# Altium footprint library Hydrolib_pcb.PcbLib: 97 footprints (part 4 of 7)
Each footprint in its own frame and in the unit in brackets; x right, y up, seen from the top. Pads: shape width x height; smd on the part's side, far side on the other; paste and mask are expansions set on the pad; w line width, h text height; cw(c..) or ccw(c..) is an arc to the next point about the centre after c.
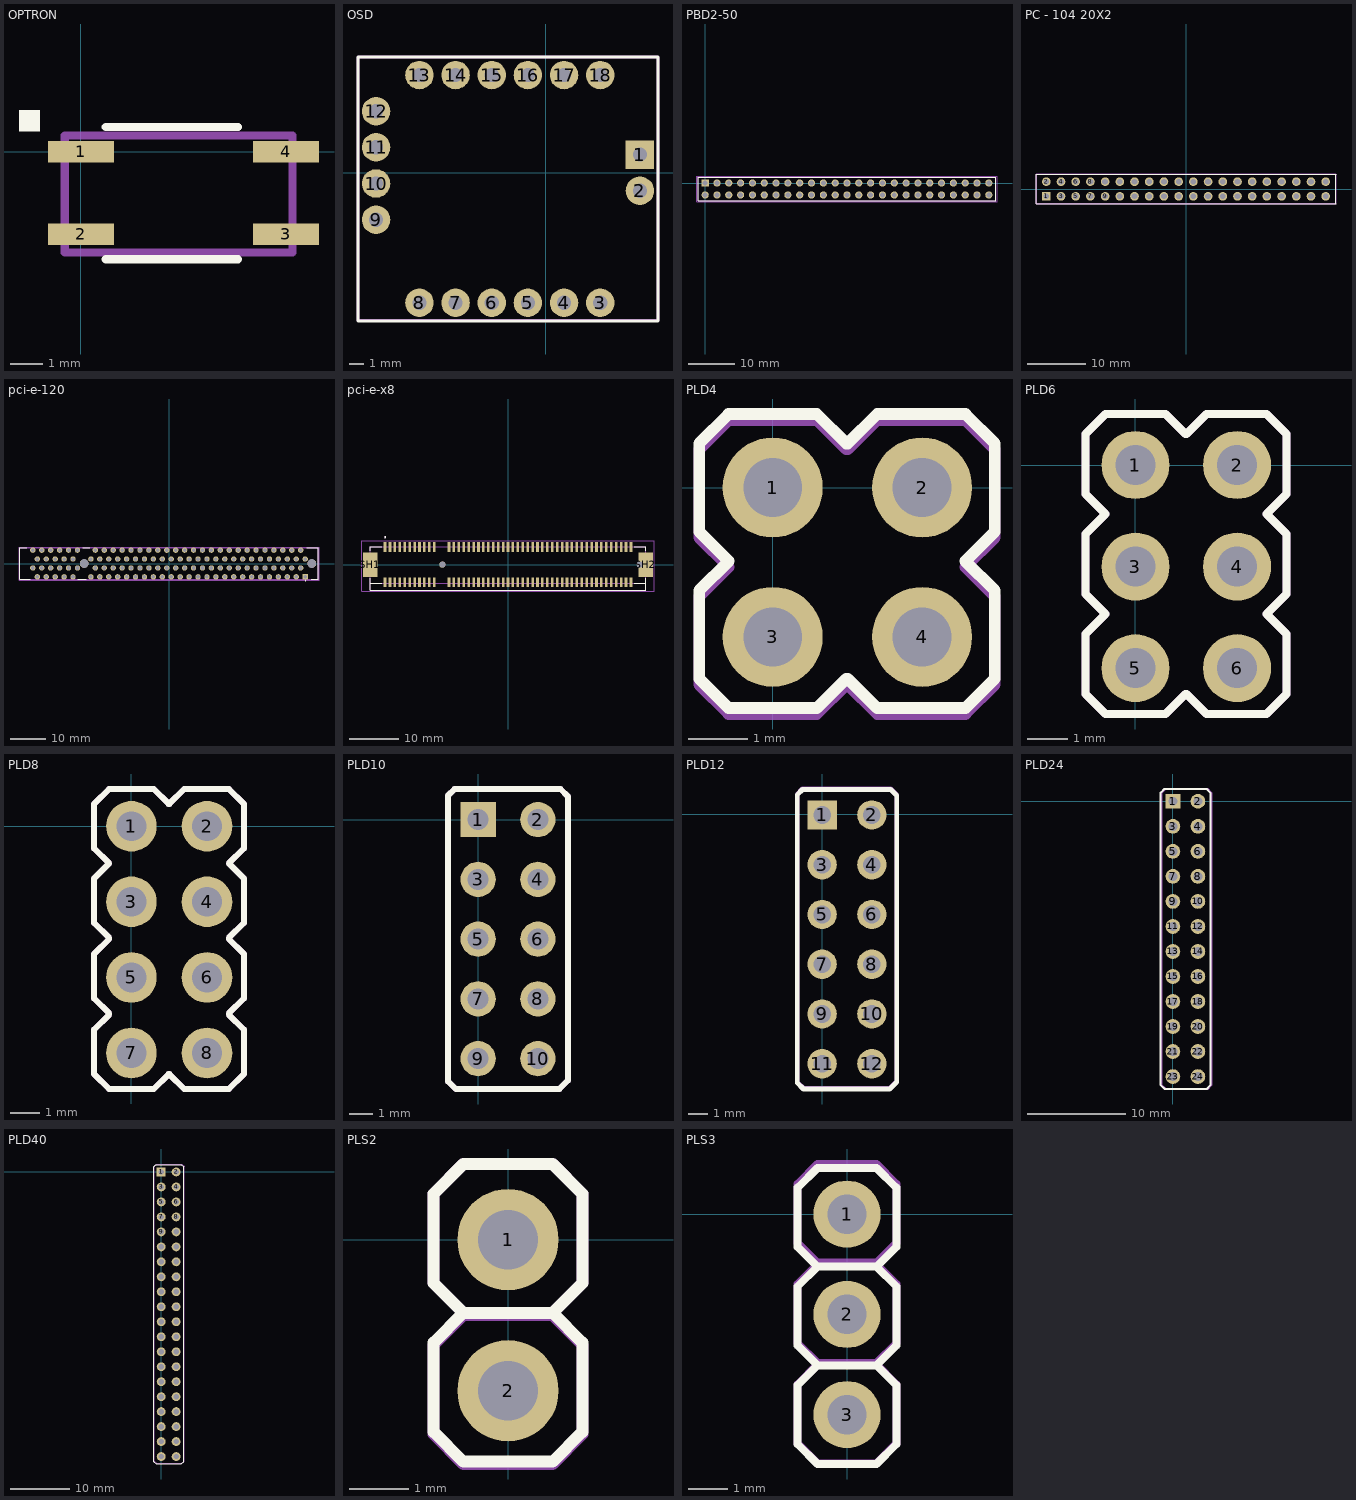
[diagram p3: the footprints below, top view; thin cyan lines are the x and y axes]

## OPTRON [mil]
pads (4):
  rect 80x26 smd: 1(0,0) 2(0,-100) 3(248.03,-100) 4(248.03,0)
Top Overlay:
  region: -75,25 -50,25 -50,50 -75,50
  lines w10: 30,-130 190,-130 ; 30,30 190,30
Pattern top:
  lines w9.84: -19.68,-122.05 -19.68,19.68 255.91,19.68 255.91,-122.05 -19.68,-122.05
  text ".Designator" at -11.81,66.93 h84.65
3D body "User Library-HCPL-181-1.STEP": height 78.74, standoff -3.96, extent -19.68,-122.05 255.91,19.69

## OSD [mm] "IDC-10 Male Connector"
height 9
pads (18):
  rect 2x2 hole 1: 1(6.604,1.27)
  round 2 hole 1: 2(6.604,-1.27) 3(3.81,-9.144) 4(1.27,-9.144) 5(-1.27,-9.144) 6(-3.81,-9.144) 7(-6.35,-9.144) 8(-8.89,-9.144) 9(-11.938,-3.302) 10(-11.938,-0.762) 11(-11.938,1.778) 12(-11.938,4.318) 13(-8.89,6.858) 14(-6.35,6.858) 15(-3.81,6.858) 16(-1.27,6.858) 17(1.27,6.858) 18(3.81,6.858)
Top Overlay:
  lines w0.2: -13.208,-1.016 -13.208,8.128 7.874,8.128 7.874,-10.425 -13.208,-10.425 -13.208,-1
Pattern top:
  lines w0.2: -13.208,-10.4 -13.208,8.128 7.874,8.128 7.874,-10.4 -13.208,-10.4
  text ".Designator" at -4.064,8.89 h2.15
3D body "Сборка1.STEP": height 4.32, standoff -6.2, extent -13.08,-10.5 7.96,8

## PBD2-50 [mm] "Socket, 2x25 Pins, Vertical, 2.54mm Pitch, Female"
height 8.51
pads (50):
  rect 1.55x1.55 hole 1.04: 1(0,0)
  round 1.55 hole 1.04: 2(0,-2.54) 3(2.54,0) 4(2.54,-2.54) 5(5.08,0) 6(5.08,-2.54) 7(7.62,0) 8(7.62,-2.54) 9(10.16,0) 10(10.16,-2.54) 11(12.7,0) 12(12.7,-2.54) 13(15.24,0) 14(15.24,-2.54) 15(17.78,0) 16(17.78,-2.54) 17(20.32,0) 18(20.32,-2.54) 19(22.86,0) 20(22.86,-2.54) 21(25.4,0) 22(25.4,-2.54) 23(27.94,0) 24(27.94,-2.54) 25(30.48,0) 26(30.48,-2.54) 27(33.02,0) 28(33.02,-2.54) 29(35.56,0) 30(35.56,-2.54) 31(38.1,0) 32(38.1,-2.54) 33(40.64,0) 34(40.64,-2.54) 35(43.18,0) 36(43.18,-2.54) 37(45.72,0) 38(45.72,-2.54) 39(48.26,0) 40(48.26,-2.54) 41(50.8,0) 42(50.8,-2.54) 43(53.34,0) 44(53.34,-2.54) 45(55.88,0) 46(55.88,-2.54) 47(58.42,0) 48(58.42,-2.54) 49(60.96,0) 50(60.96,-2.54)
Top Overlay:
  lines w0.2: -1.525,-3.745 -1.525,1.205 62.485,1.205 62.485,-3.745 -1.525,-3.745
Mechanical 13:
  lines w0.1: -1.525,-3.745 -1.525,1.205 62.485,1.205 62.485,-3.745 -1.525,-3.745
Mechanical 15:
  lines w0.05: -1.75,-3.97 -1.75,1.43 62.71,1.43 62.71,-3.97 -1.75,-3.97
3D body "SSW-125-01-X-D.step": height 8.41, standoff -2.64, extent -1.524,-3.746 62.484,1.207

## PC - 104 20X2 [mm] "Connector; Header; 20x2 Position"
height 11.1
pads (40):
  rect 1.5x1.5 hole 1: 1(-24.13,-1.27)
  round 1.5 hole 1: 2(-24.13,1.27) 3(-21.59,-1.27) 4(-21.59,1.27) 5(-19.05,-1.27) 6(-19.05,1.27) 7(-16.51,-1.27) 8(-16.51,1.27) 9(-13.97,-1.27) 10(-13.97,1.27) 11(-11.43,-1.27) 12(-11.43,1.27) 13(-8.89,-1.27) 14(-8.89,1.27) 15(-6.35,-1.27) 16(-6.35,1.27) 17(-3.81,-1.27) 18(-3.81,1.27) 19(-1.27,-1.27) 20(-1.27,1.27) 21(1.27,-1.27) 22(1.27,1.27) 23(3.81,-1.27) 24(3.81,1.27) 25(6.35,-1.27) 26(6.35,1.27) 27(8.89,-1.27) 28(8.89,1.27) 29(11.43,-1.27) 30(11.43,1.27) 31(13.97,-1.27) 32(13.97,1.27) 33(16.51,-1.27) 34(16.51,1.27) 35(19.05,-1.27) 36(19.05,1.27) 37(21.59,-1.27) 38(21.59,1.27) 39(24.13,-1.27) 40(24.13,1.27)
Top Overlay:
  lines w0.2: -25.91,-2.54 25.91,-2.54 ; -25.91,2.54 25.91,2.54 ; -25.908,-2.54 -25.908,2.54 ; 25.908,-2.54 25.908,2.54
Bottom Overlay:
  lines w0.2: -25.91,-2.54 25.91,-2.54 ; -25.91,2.54 25.91,2.54 ; -25.908,-2.54 -25.908,2.54 ; 25.908,-2.54 25.908,2.54
Pattern top:
  lines w0.25: -25.91,-2.54 -25.91,2.54 25.908,2.54 25.908,-2.54 -25.91,-2.54
  text ".Designator" at -5.93,4.53 h2.15
3D body "25953.stp": height 12.5, standoff -10.7, extent -25.88,-2.47 25.92,2.43

## PCBComponent_1 [mm]

## pci-e-120 [mm]
pads (122):
  rect 1.53x1.53 hole 1.02: 1(38.735,-3.81)
  round 1.53 hole 1.02: 2(37.465,-1.27) 3(36.195,-3.81) 4(34.925,-1.27) 5(33.655,-3.81) 6(32.385,-1.27) 7(31.115,-3.81) 8(29.845,-1.27) 9(28.575,-3.81) 10(27.305,-1.27) 11(26.035,-3.81) 12(24.765,-1.27) 13(23.495,-3.81) 14(22.225,-1.27) 15(20.955,-3.81) 16(19.685,-1.27) 17(18.415,-3.81) 18(17.145,-1.27) 19(15.875,-3.81) 20(14.605,-1.27) 21(13.335,-3.81) 22(12.065,-1.27) 23(10.795,-3.81) 24(9.525,-1.27) 25(8.255,-3.81) 26(6.985,-1.27) 27(5.715,-3.81) 28(4.445,-1.27) 29(3.175,-3.81) 30(1.905,-1.27) 31(0.635,-3.81) 32(-0.635,-1.27) 33(-1.905,-3.81) 34(-3.175,-1.27) 35(-4.445,-3.81) 36(-5.715,-1.27) 37(-6.985,-3.81) 38(-8.255,-1.27) 39(-9.525,-3.81) 40(-10.795,-1.27) 41(-12.065,-3.81) 42(-13.335,-1.27) 43(-14.605,-3.81) 44(-15.875,-1.27) 45(-17.145,-3.81) 46(-18.415,-1.27) 47(-19.685,-3.81) 48(-20.955,-1.27) 49(-22.215,-3.81) 50(-26.035,-1.27) 51(-27.305,-3.81) 52(-28.575,-1.27) 53(-29.845,-3.81) 54(-31.115,-1.27) 55(-32.385,-3.81) 56(-33.655,-1.27) 57(-34.925,-3.81) 58(-36.195,-1.27) 59(-37.465,-3.81) 60(-38.735,-1.27) 61(38.735,1.27) 62(37.465,3.81) 63(36.195,1.27) 64(34.925,3.81) 65(33.655,1.27) 66(32.385,3.81) 67(31.115,1.27) 68(29.845,3.81) 69(28.575,1.27) 70(27.305,3.81) 71(26.035,1.27) 72(24.765,3.81) 73(23.495,1.27) 74(22.225,3.81) 75(20.955,1.27) 76(19.685,3.81) 77(18.415,1.27) 78(17.145,3.81) 79(15.875,1.27) 80(14.605,3.81) 81(13.335,1.27) 82(12.065,3.81) 83(10.795,1.27) 84(9.525,3.81) 85(8.255,1.27) 86(6.985,3.81) 87(5.715,1.27) 88(4.445,3.81) 89(3.175,1.27) 90(1.905,3.81) 91(0.635,1.27) 92(-0.635,3.81) 93(-1.905,1.27) 94(-3.175,3.81) 95(-4.445,1.27) 96(-5.715,3.81) 97(-6.985,1.27) 98(-8.255,3.81) 99(-9.525,1.27) 100(-10.795,3.81) 101(-12.065,1.27) 102(-13.335,3.81) 103(-14.605,1.27) 104(-15.875,3.81) 105(-17.145,1.27) 106(-18.415,3.81) 107(-19.685,1.27) 108(-20.955,3.81) 109(-22.215,1.27) 110(-26.035,3.81) 111(-27.305,1.27) 112(-28.575,3.81) 113(-29.845,1.27) 114(-31.115,3.81) 115(-32.385,1.27) 116(-33.655,3.81) 117(-34.925,1.27) 118(-36.195,3.81) 119(-37.465,1.27) 120(-38.735,3.81)
  round 2.44 hole 2.44 unplated: ""(-24.135,0) ""(40.635,0)
Top Overlay:
  circle w0.2: c38.862,-4.873 r0.1
  lines w0.127: -40.5,4.445 -42.42,4.445 -42.42,-4.445 -39.5,-4.445 ; -26,-4.445 -23.5,-4.445 ; -24.5,4.445 -22.5,4.445 ; 39.235,4.445 42.42,4.445 42.42,-4.445 40.51,-4.445
Mechanical 13:
  lines w0.127: -42.42,-4.445 -42.42,4.445 42.42,4.445 42.42,-4.445 -42.42,-4.445
Mechanical 15:
  lines w0.05: -42.67,-4.695 -42.67,4.695 42.67,4.695 42.67,-4.695 -42.67,-4.695
3D body "1-5145154-2--3DModel-STEP-1.STEP": height 15.56, standoff -4.57, extent -42.418,-4.445 42.418,4.445

## pci-e-x8 [mm]
height 11.25
pads (102):
  rect 0.53x2 smd: A1(-25,3.6) A2(-24,3.6) A3(-23,3.6) A4(-22,3.6) A5(-21,3.6) A6(-20,3.6) A7(-19,3.6) A8(-18,3.6) A9(-17,3.6) A10(-16,3.6) A11(-15,3.6) A12(-12,3.6) A13(-11,3.6) A14(-10,3.6) A15(-9,3.6) A16(-8,3.6) A17(-7,3.6) A18(-6,3.6) A19(-5,3.6) A20(-4,3.6) A21(-3,3.6) A22(-2,3.6) A23(-1,3.6) A24(0,3.6) A25(1,3.6) A26(2,3.6) A27(3,3.6) A28(4,3.6) A29(5,3.6) A30(6,3.6) A31(7,3.6) A32(8,3.6) A33(9,3.6) A34(10,3.6) A35(11,3.6) A36(12,3.6) A37(13,3.6) A38(14,3.6) A39(15,3.6) A40(16,3.6) A41(17,3.6) A42(18,3.6) A43(19,3.6) A44(20,3.6) A45(21,3.6) A46(22,3.6) A47(23,3.6) A48(24,3.6) A49(25,3.6) B1(-25,-3.6) B2(-24,-3.6) B3(-23,-3.6) B4(-22,-3.6) B5(-21,-3.6) B6(-20,-3.6) B7(-19,-3.6) B8(-18,-3.6) B9(-17,-3.6) B10(-16,-3.6) B11(-15,-3.6) B12(-12,-3.6) B13(-11,-3.6) B14(-10,-3.6) B15(-9,-3.6) B16(-8,-3.6) B17(-7,-3.6) B18(-6,-3.6) B19(-5,-3.6) B20(-4,-3.6) B21(-3,-3.6) B22(-2,-3.6) B23(-1,-3.6) B24(0,-3.6) B25(1,-3.6) B26(2,-3.6) B27(3,-3.6) B28(4,-3.6) B29(5,-3.6) B30(6,-3.6) B31(7,-3.6) B32(8,-3.6) B33(9,-3.6) B34(10,-3.6) B35(11,-3.6) B36(12,-3.6) B37(13,-3.6) B38(14,-3.6) B39(15,-3.6) B40(16,-3.6) B41(17,-3.6) B42(18,-3.6) B43(19,-3.6) B44(20,-3.6) B45(21,-3.6) B46(22,-3.6) B47(23,-3.6) B48(24,-3.6) B49(25,-3.6)
  rect 3x5 smd: SH1(-28,0) SH2(28,0)
  round 1.25 hole 1.25 unplated: ""(-13.35,0) ""(26.8,0)
Top Overlay:
  circle w0.2: c-25,5.6 r0.1
  lines w0.127: -28,-2.82 -28,-3.75 ; -28,2.82 -28,3.6 -25.67,3.6 ; -25.67,-3.75 -28,-3.75 ; 25.67,-3.75 28,-3.75 ; 25.67,3.6 28,3.6 28,2.82 ; 28,-2.82 28,-3.75 ; -28,-3.75 -28,-5.2 28,-5.2 28,-3.75
Mechanical 13:
  circle w0.2: c-25,5.6 r0.1
  lines w0.127: -28,-3.75 -28,3.6 28,3.6 28,-3.75 ; -28,-3.75 28,-3.75 ; -28,-3.75 -28,-5.2 28,-5.2 28,-3.75
Mechanical 15:
  lines w0.05: -29.75,-5.45 -29.75,4.85 29.75,4.85 29.75,-5.45 -29.75,-5.45
3D body "step_temp.STEP": height 11.25, standoff -0.92, extent -29,-4.826 29,4.374

## PLD4 [mm]
pads (4):
  round 1.7 hole 1 paste+0: 1(0,0) 2(2.54,0) 3(0,-2.54) 4(2.54,-2.54)
Top Overlay:
  lines w0.2: 1.25,-3.25 0.75,-3.75 -0.75,-3.75 -1.25,-3.25 -1.25,-1.75 -0.75,-1.25 -1.25,-0.75 -1.25,0.75 -0.75,1.25 0.75,1.25 1.25,0.75 ; 1.275,-3.25 1.775,-3.75 3.275,-3.75 3.775,-3.25 3.775,-1.75 3.275,-1.25 3.775,-0.75 3.775,0.75 3.275,1.25 1.775,1.25 1.275,0.75
Pattern top:
  lines w0.2: 1.25,-3.35 0.75,-3.85 -0.75,-3.85 -1.25,-3.35 -1.25,-1.85 -0.75,-1.35 -1.25,-0.85 -1.25,0.65 -0.75,1.15 0.75,1.15 1.25,0.65 ; 1.275,-3.35 1.775,-3.85 3.275,-3.85 3.775,-3.35 3.775,-1.85 3.275,-1.35 3.775,-0.85 3.775,0.65 3.275,1.15 1.775,1.15 1.275,0.65
  text ".Designator" at -2.9,1.8 h2.15
3D body "User Library-PLS-1.STEP": height 8.44, standoff -3, extent -1.27,-1.27 1.27,1.27
3D body "User Library-PLS-1.STEP": height 8.44, standoff -3, extent 1.27,-1.27 3.81,1.27
3D body "User Library-PLS-1.STEP": height 8.44, standoff -3, extent -1.27,-3.81 1.27,-1.27
3D body "User Library-PLS-1.STEP": height 8.44, standoff -3, extent 1.27,-3.81 3.81,-1.27

## PLD6 [mm]
pads (6):
  round 1.7 hole 1 paste+0: 1(0,0) 2(2.54,0) 3(0,-2.54) 4(2.54,-2.54) 5(0,-5.08) 6(2.54,-5.08)
Top Overlay:
  lines w0.2: 1.25,-5.725 0.75,-6.225 -0.75,-6.225 -1.25,-5.725 -1.25,-4.225 -0.75,-3.725 -1.25,-3.225 -1.25,-1.725 -0.75,-1.225 -1.25,-0.725 -1.25,0.775 -0.75,1.275 0.75,1.275 1.25,0.775 ; 1.275,-5.725 1.775,-6.225 3.275,-6.225 3.775,-5.725 3.775,-4.225 3.275,-3.725 3.775,-3.225 3.775,-1.725 3.275,-1.225 3.775,-0.725 3.775,0.775 3.275,1.275 1.775,1.275 1.275,0.775
Pattern top:
  lines w0.2: 1.25,-5.725 0.75,-6.225 -0.75,-6.225 -1.25,-5.725 -1.25,-4.225 -0.75,-3.725 -1.25,-3.225 -1.25,-1.725 -0.75,-1.225 -1.25,-0.725 -1.25,0.775 -0.75,1.275 0.75,1.275 1.25,0.775 ; 1.275,-5.725 1.775,-6.225 3.275,-6.225 3.775,-5.725 3.775,-4.225 3.275,-3.725 3.775,-3.225 3.775,-1.725 3.275,-1.225 3.775,-0.725 3.775,0.775 3.275,1.275 1.775,1.275 1.275,0.775
  text ".Designator" at -3.1,2 h2.15
3D body "User Library-PLS-1.STEP": height 8.44, standoff -3, extent -1.27,-1.27 1.27,1.27
3D body "User Library-PLS-1.STEP": height 8.44, standoff -3, extent 1.27,-1.27 3.81,1.27
3D body "User Library-PLS-1.STEP": height 8.44, standoff -3, extent -1.27,-3.81 1.27,-1.27
3D body "User Library-PLS-1.STEP": height 8.44, standoff -3, extent 1.27,-3.81 3.81,-1.27
3D body "User Library-PLS-1.STEP": height 8.44, standoff -3, extent 1.27,-6.35 3.81,-3.81
3D body "User Library-PLS-1.STEP": height 8.44, standoff -3, extent -1.27,-6.35 1.27,-3.81

## PLD8 [mm]
pads (8):
  round 1.7 hole 1 paste+0: 1(0,0) 2(2.54,0) 3(0,-2.54) 4(2.54,-2.54) 5(0,-5.08) 6(2.54,-5.08) 7(0,-7.62) 8(2.54,-7.62)
Top Overlay:
  lines w0.2: -0.75,-6.33 -1.25,-6.83 -1.25,-8.33 -0.75,-8.83 0.75,-8.83 1.25,-8.33 ; -0.75,-6.29 -1.25,-5.79 -1.25,-4.29 -0.75,-3.79 ; -0.75,-3.75 -1.25,-3.25 -1.25,-1.75 -0.75,-1.25 -1.25,-0.75 -1.25,0.75 -0.75,1.25 0.75,1.25 1.25,0.75 ; 1.275,-8.33 1.775,-8.83 3.275,-8.83 3.775,-8.33 3.775,-6.83 3.275,-6.33 ; 1.275,0.75 1.775,1.25 3.275,1.25 3.775,0.75 3.775,-0.75 3.275,-1.25 3.775,-1.75 3.775,-3.25 3.275,-3.75 ; 3.275,-6.29 3.775,-5.79 3.775,-4.29 3.275,-3.79
Pattern top:
  lines w0.2: -0.75,-6.33 -1.25,-6.83 -1.25,-8.33 -0.75,-8.83 0.75,-8.83 1.25,-8.33 ; -0.75,-6.29 -1.25,-5.79 -1.25,-4.29 -0.75,-3.79 ; -0.75,-3.75 -1.25,-3.25 -1.25,-1.75 -0.75,-1.25 -1.25,-0.75 -1.25,0.75 -0.75,1.25 0.75,1.25 1.25,0.75 ; 1.275,-8.33 1.775,-8.83 3.275,-8.83 3.775,-8.33 3.775,-6.83 3.275,-6.33 ; 1.275,0.75 1.775,1.25 3.275,1.25 3.775,0.75 3.775,-0.75 3.275,-1.25 3.775,-1.75 3.775,-3.25 3.275,-3.75 ; 3.275,-6.29 3.775,-5.79 3.775,-4.29 3.275,-3.79
  text ".Designator" at -2.9,2 h2.15
3D body "User Library-PLS-1.STEP": height 8.44, standoff -3, extent -1.27,-1.27 1.27,1.27
3D body "User Library-PLS-1.STEP": height 8.44, standoff -3, extent 1.27,-1.27 3.81,1.27
3D body "User Library-PLS-1.STEP": height 8.44, standoff -3, extent -1.27,-3.81 1.27,-1.27
3D body "User Library-PLS-1.STEP": height 8.44, standoff -3, extent 1.27,-3.81 3.81,-1.27
3D body "User Library-PLS-1.STEP": height 8.44, standoff -3, extent 1.27,-6.35 3.81,-3.81
3D body "User Library-PLS-1.STEP": height 8.44, standoff -3, extent -1.27,-6.35 1.27,-3.81
3D body "User Library-PLS-1.STEP": height 8.44, standoff -3, extent 1.27,-8.89 3.81,-6.35
3D body "User Library-PLS-1.STEP": height 8.44, standoff -3, extent -1.27,-8.89 1.27,-6.35

## PLD10 [mm]
pads (10):
  rect 1.5x1.5 hole 0.9: 1(0,0)
  round 1.5 hole 0.9: 2(2.54,0) 3(0,-2.54) 4(2.54,-2.54) 5(0,-5.08) 6(2.54,-5.08) 7(0,-7.62) 8(2.54,-7.62) 9(0,-10.16) 10(2.54,-10.16)
Top Overlay:
  lines w0.254: -1.27,-11.13 -1.27,1.03 -1,1.3 3.5,1.3 3.81,0.99 3.81,-11.09 3.45,-11.45 -0.95,-11.45 -1.27,-11.13
Pattern top:
  lines w0.254: -1.27,-11.13 -1.27,1.03 -1,1.3 3.5,1.3 3.81,0.99 3.81,-11.09 3.45,-11.45 -0.95,-11.45 -1.27,-11.13
  text ".Designator" at -3.1,2.1 h2.15
3D body "User Library-PLS-1.STEP": height 8.44, standoff -3, extent -1.27,-1.27 1.27,1.27
3D body "User Library-PLS-1.STEP": height 8.44, standoff -3, extent 1.27,-1.27 3.81,1.27
3D body "User Library-PLS-1.STEP": height 8.44, standoff -3, extent -1.27,-3.81 1.27,-1.27
3D body "User Library-PLS-1.STEP": height 8.44, standoff -3, extent 1.27,-3.81 3.81,-1.27
3D body "User Library-PLS-1.STEP": height 8.44, standoff -3, extent -1.27,-6.35 1.27,-3.81
3D body "User Library-PLS-1.STEP": height 8.44, standoff -3, extent 1.27,-6.35 3.81,-3.81
3D body "User Library-PLS-1.STEP": height 8.44, standoff -3, extent 1.27,-8.89 3.81,-6.35
3D body "User Library-PLS-1.STEP": height 8.44, standoff -3, extent -1.27,-8.89 1.27,-6.35
3D body "User Library-PLS-1.STEP": height 8.44, standoff -3, extent -1.27,-11.43 1.27,-8.89
3D body "User Library-PLS-1.STEP": height 8.44, standoff -3, extent 1.27,-11.43 3.81,-8.89

## PLD12 [mm]
pads (12):
  rect 1.5x1.5 hole 0.9: 1(0,-0.025)
  round 1.5 hole 0.9: 2(2.54,-0.025) 3(0,-2.565) 4(2.54,-2.565) 5(0,-5.105) 6(2.54,-5.105) 7(0,-7.645) 8(2.54,-7.645) 9(0,-10.185) 10(2.54,-10.185) 11(0,-12.725) 12(2.54,-12.725)
Top Overlay:
  lines w0.254: -1.27,-13.7 -1.27,1.005 -1,1.275 3.5,1.275 3.81,0.965 3.81,-13.65 ; -1.27,-13.695 -0.95,-14.015 3.45,-14.015 3.81,-13.655
Pattern top:
  lines w0.254: -1.27,-13.675 -1.27,1.03 -1,1.3 3.5,1.3 3.81,0.99 3.81,-13.625 ; -1.27,-13.67 -0.95,-13.99 3.45,-13.99 3.81,-13.63
  text ".Designator" at -2.8,2.2 h2.15
3D body "User Library-PLS-1.STEP": height 8.44, standoff -3, extent 1.27,-13.995 3.81,-11.455
3D body "User Library-PLS-1.STEP": height 8.44, standoff -3, extent -1.27,-13.995 1.27,-11.455
3D body "User Library-PLS-1.STEP": height 8.44, standoff -3, extent -1.27,-1.295 1.27,1.245
3D body "User Library-PLS-1.STEP": height 8.44, standoff -3, extent 1.27,-1.295 3.81,1.245
3D body "User Library-PLS-1.STEP": height 8.44, standoff -3, extent -1.27,-3.835 1.27,-1.295
3D body "User Library-PLS-1.STEP": height 8.44, standoff -3, extent 1.27,-3.835 3.81,-1.295
3D body "User Library-PLS-1.STEP": height 8.44, standoff -3, extent -1.27,-6.375 1.27,-3.835
3D body "User Library-PLS-1.STEP": height 8.44, standoff -3, extent 1.27,-6.375 3.81,-3.835
3D body "User Library-PLS-1.STEP": height 8.44, standoff -3, extent 1.27,-8.915 3.81,-6.375
3D body "User Library-PLS-1.STEP": height 8.44, standoff -3, extent -1.27,-8.915 1.27,-6.375
3D body "User Library-PLS-1.STEP": height 8.44, standoff -3, extent -1.27,-11.455 1.27,-8.915
3D body "User Library-PLS-1.STEP": height 8.44, standoff -3, extent 1.27,-11.455 3.81,-8.915

## PLD24 [mm]
pads (24):
  rect 1.5x1.5 hole 0.9: 1(0,0)
  round 1.5 hole 0.9: 2(2.54,0) 3(0,-2.54) 4(2.54,-2.54) 5(0,-5.08) 6(2.54,-5.08) 7(0,-7.62) 8(2.54,-7.62) 9(0,-10.16) 10(2.54,-10.16) 11(0,-12.7) 12(2.54,-12.7) 13(0,-15.24) 14(2.54,-15.24) 15(0,-17.78) 16(2.54,-17.78) 17(0,-20.32) 18(2.54,-20.32) 19(0,-22.86) 20(2.54,-22.86) 21(0,-25.4) 22(2.54,-25.4) 23(0,-27.94) 24(2.54,-27.94)
Top Overlay:
  lines w0.2: -1.25,-28.8 -0.85,-29.2 3.425,-29.2 3.81,-28.815 3.81,0.865 3.425,1.25 -0.875,1.25 -1.25,0.875 -1.25,-28.8
Pattern top:
  lines w0.2: -1.15,-28.8 -0.75,-29.2 3.525,-29.2 3.91,-28.815 3.91,0.865 3.525,1.25 -0.775,1.25 -1.15,0.875 -1.15,-28.8
  text ".Designator" at -3,2.3 h2.15
3D body "User Library-PLS-1.STEP": height 8.44, standoff -3, extent -1.27,-1.27 1.27,1.27
3D body "User Library-PLS-1.STEP": height 8.44, standoff -3, extent 1.27,-1.27 3.81,1.27
3D body "User Library-PLS-1.STEP": height 8.44, standoff -3, extent -1.27,-3.81 1.27,-1.27
3D body "User Library-PLS-1.STEP": height 8.44, standoff -3, extent 1.27,-3.81 3.81,-1.27
3D body "User Library-PLS-1.STEP": height 8.44, standoff -3, extent -1.27,-6.35 1.27,-3.81
3D body "User Library-PLS-1.STEP": height 8.44, standoff -3, extent 1.27,-6.35 3.81,-3.81
3D body "User Library-PLS-1.STEP": height 8.44, standoff -3, extent -1.27,-8.89 1.27,-6.35
3D body "User Library-PLS-1.STEP": height 8.44, standoff -3, extent 1.27,-8.89 3.81,-6.35
3D body "User Library-PLS-1.STEP": height 8.44, standoff -3, extent -1.27,-11.43 1.27,-8.89
3D body "User Library-PLS-1.STEP": height 8.44, standoff -3, extent 1.27,-11.43 3.81,-8.89
3D body "User Library-PLS-1.STEP": height 8.44, standoff -3, extent -1.27,-13.97 1.27,-11.43
3D body "User Library-PLS-1.STEP": height 8.44, standoff -3, extent 1.27,-13.97 3.81,-11.43
3D body "User Library-PLS-1.STEP": height 8.44, standoff -3, extent -1.27,-16.51 1.27,-13.97
3D body "User Library-PLS-1.STEP": height 8.44, standoff -3, extent 1.27,-16.51 3.81,-13.97
3D body "User Library-PLS-1.STEP": height 8.44, standoff -3, extent -1.27,-19.05 1.27,-16.51
3D body "User Library-PLS-1.STEP": height 8.44, standoff -3, extent 1.27,-19.05 3.81,-16.51
3D body "User Library-PLS-1.STEP": height 8.44, standoff -3, extent -1.27,-21.59 1.27,-19.05
3D body "User Library-PLS-1.STEP": height 8.44, standoff -3, extent 1.27,-21.59 3.81,-19.05
3D body "User Library-PLS-1.STEP": height 8.44, standoff -3, extent -1.27,-24.13 1.27,-21.59
3D body "User Library-PLS-1.STEP": height 8.44, standoff -3, extent 1.27,-24.13 3.81,-21.59
3D body "User Library-PLS-1.STEP": height 8.44, standoff -3, extent -1.27,-26.67 1.27,-24.13
3D body "User Library-PLS-1.STEP": height 8.44, standoff -3, extent 1.27,-26.67 3.81,-24.13
3D body "User Library-PLS-1.STEP": height 8.44, standoff -3, extent -1.27,-29.21 1.27,-26.67
3D body "User Library-PLS-1.STEP": height 8.44, standoff -3, extent 1.27,-29.21 3.81,-26.67

## PLD40 [mm]
pads (40):
  rect 1.5x1.5 hole 0.9: 1(0,0)
  round 1.5 hole 0.9: 2(2.54,0) 3(0,-2.54) 4(2.54,-2.54) 5(0,-5.08) 6(2.54,-5.08) 7(0,-7.62) 8(2.54,-7.62) 9(0,-10.16) 10(2.54,-10.16) 11(0,-12.7) 12(2.54,-12.7) 13(0,-15.24) 14(2.54,-15.24) 15(0,-17.78) 16(2.54,-17.78) 17(0,-20.32) 18(2.54,-20.32) 19(0,-22.86) 20(2.54,-22.86) 21(0,-25.4) 22(2.54,-25.4) 23(0,-27.94) 24(2.54,-27.94) 25(0,-30.475) 26(2.54,-30.475) 27(0,-33.015) 28(2.54,-33.015) 29(0,-35.555) 30(2.54,-35.555) 31(0,-38.095) 32(2.54,-38.095) 33(0,-40.635) 34(2.54,-40.635) 35(0,-43.175) 36(2.54,-43.175) 37(0,-45.715) 38(2.54,-45.715) 39(0,-48.255) 40(2.54,-48.255)
Top Overlay:
  lines w0.2: -1.25,-49.115 -0.85,-49.515 3.425,-49.515 3.81,-49.13 3.81,-28.815 3.81,0.865 3.425,1.25 -0.875,1.25 -1.25,0.875 -1.25,-28.8 -1.25,-49.115
Pattern top:
  lines w0.2: -1.15,-49.015 -0.75,-49.415 3.525,-49.415 3.91,-49.03 3.91,-28.715 3.91,0.965 3.525,1.35 -0.775,1.35 -1.15,0.975 -1.15,-28.7 -1.15,-49.015
  text ".Designator" at -3.1,2.3 h2.15
3D body "User Library-PLS-1.STEP": height 8.44, standoff -3, extent 1.27,-29.21 3.81,-26.67
3D body "User Library-PLS-1.STEP": height 8.44, standoff -3, extent -1.27,-29.21 1.27,-26.67
3D body "User Library-PLS-1.STEP": height 8.44, standoff -3, extent 1.27,-26.67 3.81,-24.13
3D body "User Library-PLS-1.STEP": height 8.44, standoff -3, extent -1.27,-26.67 1.27,-24.13
3D body "User Library-PLS-1.STEP": height 8.44, standoff -3, extent 1.27,-24.13 3.81,-21.59
3D body "User Library-PLS-1.STEP": height 8.44, standoff -3, extent -1.27,-24.13 1.27,-21.59
3D body "User Library-PLS-1.STEP": height 8.44, standoff -3, extent 1.27,-21.59 3.81,-19.05
3D body "User Library-PLS-1.STEP": height 8.44, standoff -3, extent -1.27,-21.59 1.27,-19.05
3D body "User Library-PLS-1.STEP": height 8.44, standoff -3, extent 1.27,-19.05 3.81,-16.51
3D body "User Library-PLS-1.STEP": height 8.44, standoff -3, extent -1.27,-19.05 1.27,-16.51
3D body "User Library-PLS-1.STEP": height 8.44, standoff -3, extent 1.27,-16.51 3.81,-13.97
3D body "User Library-PLS-1.STEP": height 8.44, standoff -3, extent -1.27,-16.51 1.27,-13.97
3D body "User Library-PLS-1.STEP": height 8.44, standoff -3, extent 1.27,-13.97 3.81,-11.43
3D body "User Library-PLS-1.STEP": height 8.44, standoff -3, extent -1.27,-13.97 1.27,-11.43
3D body "User Library-PLS-1.STEP": height 8.44, standoff -3, extent 1.27,-11.43 3.81,-8.89
3D body "User Library-PLS-1.STEP": height 8.44, standoff -3, extent -1.27,-11.43 1.27,-8.89
3D body "User Library-PLS-1.STEP": height 8.44, standoff -3, extent 1.27,-8.89 3.81,-6.35
3D body "User Library-PLS-1.STEP": height 8.44, standoff -3, extent -1.27,-8.89 1.27,-6.35
3D body "User Library-PLS-1.STEP": height 8.44, standoff -3, extent 1.27,-6.35 3.81,-3.81
3D body "User Library-PLS-1.STEP": height 8.44, standoff -3, extent -1.27,-6.35 1.27,-3.81
3D body "User Library-PLS-1.STEP": height 8.44, standoff -3, extent 1.27,-3.81 3.81,-1.27
3D body "User Library-PLS-1.STEP": height 8.44, standoff -3, extent -1.27,-3.81 1.27,-1.27
3D body "User Library-PLS-1.STEP": height 8.44, standoff -3, extent 1.27,-1.27 3.81,1.27
3D body "User Library-PLS-1.STEP": height 8.44, standoff -3, extent -1.27,-1.27 1.27,1.27
3D body "User Library-PLS-1.STEP": height 8.44, standoff -3, extent -1.27,-31.745 1.27,-29.205
3D body "User Library-PLS-1.STEP": height 8.44, standoff -3, extent 1.27,-31.745 3.81,-29.205
3D body "User Library-PLS-1.STEP": height 8.44, standoff -3, extent -1.27,-34.285 1.27,-31.745
3D body "User Library-PLS-1.STEP": height 8.44, standoff -3, extent 1.27,-34.285 3.81,-31.745
3D body "User Library-PLS-1.STEP": height 8.44, standoff -3, extent -1.27,-36.825 1.27,-34.285
3D body "User Library-PLS-1.STEP": height 8.44, standoff -3, extent 1.27,-36.825 3.81,-34.285
3D body "User Library-PLS-1.STEP": height 8.44, standoff -3, extent -1.27,-39.365 1.27,-36.825
3D body "User Library-PLS-1.STEP": height 8.44, standoff -3, extent 1.27,-39.365 3.81,-36.825
3D body "User Library-PLS-1.STEP": height 8.44, standoff -3, extent -1.27,-41.905 1.27,-39.365
3D body "User Library-PLS-1.STEP": height 8.44, standoff -3, extent 1.27,-41.905 3.81,-39.365
3D body "User Library-PLS-1.STEP": height 8.44, standoff -3, extent -1.27,-44.445 1.27,-41.905
3D body "User Library-PLS-1.STEP": height 8.44, standoff -3, extent 1.27,-44.445 3.81,-41.905
3D body "User Library-PLS-1.STEP": height 8.44, standoff -3, extent -1.27,-46.985 1.27,-44.445
3D body "User Library-PLS-1.STEP": height 8.44, standoff -3, extent 1.27,-46.985 3.81,-44.445
3D body "User Library-PLS-1.STEP": height 8.44, standoff -3, extent -1.27,-49.525 1.27,-46.985
3D body "User Library-PLS-1.STEP": height 8.44, standoff -3, extent 1.27,-49.525 3.81,-46.985

## PLS2 [mm]
pads (2):
  round 1.7 hole 1 paste+0: 1(0,0) 2(0,-2.54)
Top Overlay:
  lines w0.2: -0.75,-1.23 -1.25,-0.73 -1.25,0.77 -0.75,1.27 0.75,1.27 1.25,0.77 1.25,-0.73 0.75,-1.23 ; -0.75,-1.23 -1.25,-1.73 -1.25,-3.23 -0.75,-3.73 0.75,-3.73 1.25,-3.23 1.25,-1.73 0.75,-1.23 ; -0.75,-1.23 0.75,-1.23
Pattern top:
  lines w0.2: -1.25,-3.27 -1.25,-1.77 -0.75,-1.27 0.75,-1.27 1.25,-1.77 1.25,-3.27 0.75,-3.77 -0.75,-3.77 -1.25,-3.27 ; -1.25,-0.73 -1.25,0.77 -0.75,1.27 0.75,1.27 1.25,0.77 1.25,-0.73 0.75,-1.23 -0.75,-1.23 -1.25,-0.73
  text ".Designator" at -4.2,1.9 h2.15
3D body "User Library-PLS-1.STEP": height 8.44, standoff -3, extent -1.27,-1.27 1.27,1.27
3D body "User Library-PLS-1.STEP": height 8.44, standoff -3, extent -1.27,-3.81 1.27,-1.27

## PLS3 [mm]
pads (3):
  round 1.7 hole 1 paste+0: 1(0,0) 2(0,-2.54) 3(0,-5.08)
Top Overlay:
  lines w0.2: -0.75,-3.83 -1.25,-3.33 -1.25,-1.83 -0.75,-1.33 ; -0.75,-3.83 -1.25,-4.33 -1.25,-5.83 -0.75,-6.33 0.75,-6.33 1.25,-5.83 1.25,-4.33 0.75,-3.83 ; -0.75,-3.83 0.75,-3.83 ; -0.75,-1.33 -1.25,-0.83 -1.25,0.67 -0.75,1.17 0.75,1.17 1.25,0.67 1.25,-0.83 0.75,-1.33 ; -0.75,-1.33 0.75,-1.33 ; 0.75,-3.83 1.25,-3.33 1.25,-1.83 0.75,-1.33
Pattern top:
  lines w0.2: -1.25,-5.81 -1.25,-4.31 -0.75,-3.81 0.75,-3.81 1.25,-4.31 1.25,-5.81 0.75,-6.31 -0.75,-6.31 -1.25,-5.81 ; -1.25,-3.27 -1.25,-1.77 -0.75,-1.27 0.75,-1.27 1.25,-1.77 1.25,-3.27 0.75,-3.77 -0.75,-3.77 -1.25,-3.27 ; -1.25,-0.73 -1.25,0.77 -0.75,1.27 0.75,1.27 1.25,0.77 1.25,-0.73 0.75,-1.23 -0.75,-1.23 -1.25,-0.73
  text ".Designator" at -4.3,1.9 h2.15
3D body "User Library-PLS-1.STEP": height 8.44, standoff -3, extent -1.27,-1.27 1.27,1.27
3D body "User Library-PLS-1.STEP": height 8.44, standoff -3, extent -1.27,-3.81 1.27,-1.27
3D body "User Library-PLS-1.STEP": height 8.44, standoff -3, extent -1.27,-6.35 1.27,-3.81